# Altium footprint library ATM1099C-0627-ssy-1.brd.PcbLib: 48 footprints (part 2 of 3)
Each footprint in its own frame and in the unit in brackets; x right, y up, seen from the top. Pads: shape width x height; smd on the part's side, far side on the other; paste and mask are expansions set on the pad; w line width, h text height; cw(c..) or ccw(c..) is an arc to the next point about the centre after c.
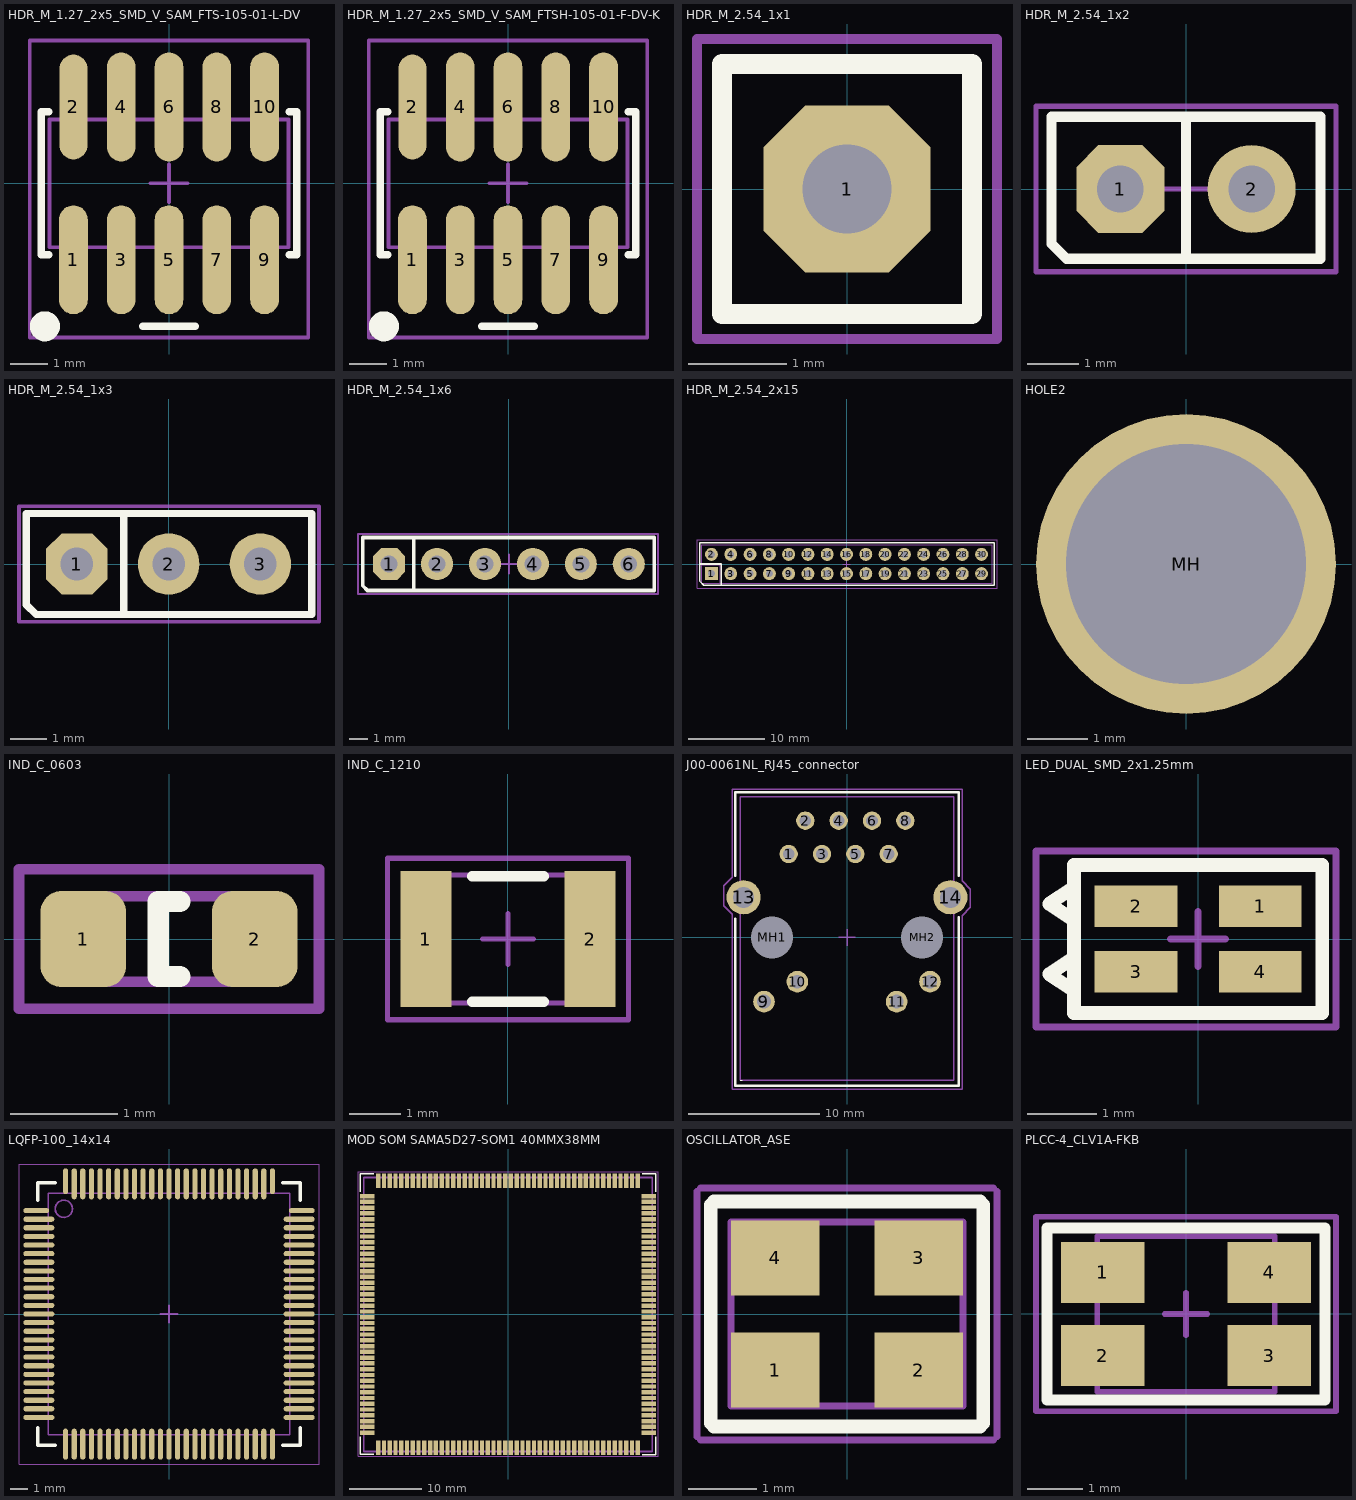
[diagram p1: the footprints below, top view; thin cyan lines are the x and y axes]

## HDR_M_1.27_2x5_SMD_V_SAM_FTS-105-01-L-DV [mil]
height 235
pads (10):
  oval 30x114 smd: 1(-100,-80) 3(-50,-80) 4(-50,80) 5(0,-80) 6(0,80) 7(50,-80) 8(50,80) 9(100,-80) 10(100,80)
  oval 29.13x109.84 smd: 2(-100,80)
Top Overlay:
  circle w15.75: c-129.92,-149.61 r7.87
  lines w7.87: -125.98,-74.8 -133.86,-74.8 -133.86,74.8 -125.98,74.8 ; -27.56,-149.61 27.56,-149.61 ; 125.98,-74.8 133.86,-74.8 133.86,74.8 125.98,74.8
Mechanical 11:
  lines w3.94: -125,-66.93 125,-66.93 125,66.93 -125,66.93 -125,-66.93
  text "'.Designator'" at -46.26,-17.72 h39.37
  text "1" at -133.86,-125.98 h39.37
Mechanical 15:
  lines w3.94: -19.68,0 19.68,0 ; 0,-19.68 0,19.68 ; -145.67,-161.42 145.67,-161.42 145.67,149.61 -145.67,149.61 -145.67,-161.42
3D body "FTS-105-01-L-DV.stp": height 169.75, standoff -0.25, extent -124.99,-118.93 125,111.07

## HDR_M_1.27_2x5_SMD_V_SAM_FTSH-105-01-F-DV-K [mil]
height 235
pads (10):
  oval 30x114 smd: 1(-100,-80) 3(-50,-80) 4(-50,80) 5(0,-80) 6(0,80) 7(50,-80) 8(50,80) 9(100,-80) 10(100,80)
  oval 29.13x109.84 smd: 2(-100,80)
Top Overlay:
  circle w15.75: c-129.92,-149.61 r7.87
  lines w7.87: -125.98,-74.8 -133.86,-74.8 -133.86,74.8 -125.98,74.8 ; -27.56,-149.61 27.56,-149.61 ; 125.98,-74.8 133.86,-74.8 133.86,74.8 125.98,74.8
Mechanical 11:
  lines w3.94: -125,-66.93 125,-66.93 125,66.93 -125,66.93 -125,-66.93
  text "'.Designator'" at -35.43,-24.61 h39.37
  text "1" at -133.86,-125.98 h39.37
Mechanical 15:
  lines w3.94: -19.68,0 19.68,0 ; 0,-19.68 0,19.68 ; -145.67,-161.42 145.67,-161.42 145.67,149.61 -145.67,149.61 -145.67,-161.42
3D body "FTSH-105-01-F-DV-K.stp": height 240.75, standoff -0.25, extent -125,-115 125,115

## HDR_M_2.54_1x1 [mm] "Header Male Vertical 1 Way"
pads (1):
  oct 1.7x1.7 hole 0.9: 1(0,0)
Top Overlay:
  lines w0.2: -1.27,-1.27 -1.27,1.27 1.27,1.27 1.27,-1.27 -1.27,-1.27
Mechanical 11:
  lines w0.1: -1.27,-1.27 1.27,-1.27 1.27,1.27 -1.27,1.27 -1.27,-1.27
  text ".Designator" at -0.65,-0.4 h0.8
Mechanical 15:
  lines w0.1: -1.524,-1.524 -1.524,1.524 1.524,1.524 1.524,-1.524 -1.524,-1.524
3D body "HDR_M_254_1x1.step": height 5.94, standoff -2.94, extent -1.27,-1.27 1.27,1.27

## HDR_M_2.54_1x2 [mm] "Header Male Vertical 4 Way 2.54mm Pitch"
pads (2):
  oct 1.7x1.7 hole 0.9: 1(-1.27,0)
  round 1.7 hole 0.9: 2(1.27,0)
Top Overlay:
  lines w0.2: 0,-1.3 0,1.35 ; -2.6,-1.06 -2.6,1.4 2.6,1.4 2.6,-1.35 -2.31,-1.35 -2.6,-1.06
Mechanical 11:
  lines w0.1: -2.6,-1.06 -2.31,-1.35 2.6,-1.35 2.6,1.4 -2.6,1.4 -2.6,-1.06
  text ".Designator" at 0.775,0.475 h1
Mechanical 15:
  lines w0.1: -0.5,0 0.5,0 ; 0,-0.5 0,0.5 ; -2.9,-1.6 2.9,-1.6 2.9,1.6 -2.9,1.6 -2.9,-1.6
3D body "HDR_M_254_1x2.step": height 5.94, standoff -2.94, extent -2.54,-1.27 2.54,1.27

## HDR_M_2.54_1x3 [mm] "Header Male Vertical 4 Way P=2.54mm"
pads (3):
  oct 1.7x1.7 hole 0.9: 1(-2.54,0)
  round 1.7 hole 0.9: 2(0,0) 3(2.54,0)
Top Overlay:
  lines w0.2: -1.24,-1.4 -1.24,1.4 ; -3.94,-1.125 -3.665,-1.4 3.96,-1.4 3.96,1.4 -3.94,1.4 -3.94,-1.125
Mechanical 11:
  lines w0.1: -1.24,-1.4 -1.24,1.4 ; -3.94,-1.125 -3.94,1.4 3.96,1.4 3.96,-1.4 -3.665,-1.4 -3.94,-1.125
  text ".Designator" at 1.025,0.65 h1
Mechanical 15:
  lines w0.1: -4.14,-1.6 -4.14,1.6 4.16,1.6 4.16,-1.6 -4.14,-1.6
3D body "HDR_M_254_1x3.step": height 5.94, standoff -2.94, extent -3.8,-1.265 3.82,1.275

## HDR_M_2.54_1x6 [mm] "Header Male Vertical 6 Way 2.54mm Pitch"
pads (6):
  oct 1.7x1.7 hole 0.9: 1(-6.35,0)
  round 1.7 hole 0.9: 2(-3.81,0) 3(-1.27,0) 4(1.27,0) 5(3.81,0) 6(6.35,0)
Top Overlay:
  lines w0.2: -5.05,-1.4 -5.05,1.4 ; -7.75,-1.15 -7.5,-1.4 7.7,-1.4 7.7,1.4 -7.75,1.4 -7.75,-1.15
Mechanical 11:
  lines w0.1: -5.05,-1.4 -5.05,1.4 ; -7.75,-1.15 -7.75,1.4 7.7,1.4 7.7,-1.4 -7.5,-1.4 -7.75,-1.15
  text ".Designator" at 1.075,0.55 h1
Mechanical 15:
  lines w0.1: -0.5,0 0.5,0 ; 0,-0.5 0,0.5 ; -8,-1.6 -8,1.6 7.9,1.6 7.9,-1.6 -8,-1.6
3D body "Samtec-TSW-106-07-G-S.step": height 8.38, standoff -2.54, extent -7.62,-1.27 7.62,1.27

## HDR_M_2.54_2x15 [mm] "Header Male Vertical 2x10 Way 2.54mm Pitch"
pads (30):
  rect 1.7x1.7 hole 0.9: 1(-17.788,-1.27)
  round 1.7 hole 0.9: 2(-17.788,1.27) 3(-15.248,-1.27) 4(-15.248,1.27) 5(-12.708,-1.27) 6(-12.708,1.27) 7(-10.168,-1.27) 8(-10.168,1.27) 9(-7.628,-1.27) 10(-7.628,1.27) 11(-5.088,-1.27) 12(-5.088,1.27) 13(-2.548,-1.27) 14(-2.548,1.27) 15(-0.008,-1.27) 16(-0.008,1.27) 17(2.532,-1.27) 18(2.532,1.27) 19(5.072,-1.27) 20(5.072,1.27) 21(7.612,-1.27) 22(7.612,1.27) 23(10.152,-1.27) 24(10.152,1.27) 25(12.692,-1.27) 26(12.692,1.27) 27(15.232,-1.27) 28(15.232,1.27) 29(17.772,-1.27) 30(17.772,1.27)
Top Overlay:
  lines w0.2: -19.312,0 -16.51,0 -16.51,-2.794 ; -19.312,-2.286 -19.312,2.794 19.423,2.794 19.423,-2.794 -18.804,-2.794 -19.312,-2.286
Mechanical 11:
  lines w0.1: -19.058,-0.127 -16.645,-0.127 -16.645,-2.54 ; -19.058,2.54 19.169,2.54 19.169,-2.54 -19.058,-2.54 -19.058,2.54 ; -19.058,2.54 -19.058,2.54
  text ".Designator" at 0,-1.27 h1
Mechanical 15:
  lines w0.1: -0.516,0 0.484,0 ; -0.008,-0.508 -0.008,0.508 ; -19.693,-3.175 -19.693,3.175 19.804,3.175 19.804,-3.175 -19.693,-3.175
3D body "pin_header_awl254-dg-g30d.stp": height 8.5, standoff -3, extent -19.058,-2.54 19.042,2.54

## HOLE2 [mm]
pads (1):
  round 5 hole 4: MH(0,0)
Mechanical 1:
  text "1" at -0.254,0 h0.64

## IND_C_0603 [mm] "Chip Inductor, 2-Leads, Body 1.6x0.8mm, IPC Medium Density"
height 0.8
pads (2):
  rrect50% 0.8x0.9 smd: 1(-0.8,0) 2(0.8,0)
Top Overlay:
  lines w0.2: 0.1,-0.35 -0.1,-0.35 -0.1,0.35 0.1,0.35
Mechanical 11:
  lines w0.1: -0.8,-0.4 0.8,-0.4 0.8,0.4 -0.8,0.4 -0.8,-0.4
  text ".Designator" at -0.2,-0.175 h0.35
Mechanical 13:
  lines w0.1: -0.8,-0.4 -0.8,0.4 0.8,0.4 0.8,-0.4 -0.8,-0.4
Mechanical 15:
  lines w0.1: -1.4,-0.65 -1.4,0.65 1.4,0.65 1.4,-0.65 -1.4,-0.65
  text "L" at -0.2,-0.29 h0.6
3D body "IND_C_0603.step": height 0.95, standoff 0, extent -0.8,-0.4 0.8,0.4

## IND_C_1210 [mm] "Chip Inductor, 2-Leads, Body 3.2x2.5mm, IPC Medium Density"
height 2.2
pads (2):
  rect 1x2.65 smd: 1(-1.6,0) 2(1.6,0)
Top Overlay:
  lines w0.2: -0.7,-1.225 0.7,-1.225 ; -0.7,1.225 0.7,1.225
Mechanical 11:
  lines w0.1: -2.35,-1.575 2.35,-1.575 2.35,1.575 -2.35,1.575 -2.35,-1.575
  text ".Designator" at 0.803,0.481 h1
Mechanical 13:
  lines w0.1: -1.6,-1.25 -1.6,1.25 1.6,1.25 1.6,-1.25 -1.6,-1.25
Mechanical 15:
  lines w0.1: -0.5,0 0.5,0 ; 0,-0.5 0,0.5 ; -2.35,-1.575 -2.35,1.575 2.35,1.575 2.35,-1.575 -2.35,-1.575
3D body "RES_2010.step": height 0.57, standoff 0, extent -1.55,-1.301 1.55,1.301

## J00-0061NL_RJ45_connector [mm] "J00-0061NL_RJ45_connector"
pads (16):
  round 1.4 / inner round 1.524 / far side round 1.4 hole 0.9: 1(-4.445,6.35) 2(-3.175,8.89) 3(-1.905,6.35) 4(-0.635,8.89) 5(0.635,6.35) 6(1.905,8.89) 7(3.175,6.35) 8(4.445,8.89)
  round 1.65 / inner round 1.524 / far side round 1.65 hole 1.05: 9(-6.325,-4.9) 10(-3.785,-3.38) 11(3.785,-4.9) 12(6.325,-3.38)
  round 2.6 / inner round 1.524 / far side round 2.6 hole 1.6: 13(-7.875,3.05) 14(7.875,3.05)
  round 2.3 / inner round 1.524 / far side round 2.3 hole 3.2 unplated: MH1(-5.715,0)
  round 2 / inner round 1.524 / far side round 2 hole 3.2 unplated: MH2(5.715,0)
Top Overlay:
  lines w0.025: -8.15,-10.9 -8,-10.9
  lines w0.2: -8.509,1.397 -8.509,-11.303 8.509,-11.303 8.509,1.524 ; -8.509,4.699 -8.509,11.049 -8.382,11.049 8.382,11.049 8.509,11.049 8.509,4.699
Mechanical 11:
  lines w0.1: -8.15,-10.9 -8.15,1.45 -8.15,10.7 8.15,10.7 8.15,1.45 8.15,-10.9 -8.15,-10.9
  text "'.Designator'" at 1.65,0.225 h1
  text "1" at -5.207,5.969 h1
Mechanical 15:
  lines w0.1: -0.635,0 0.635,0 ; 0,-0.635 0,0.635 ; -9.398,2.413 -8.763,1.778 -8.763,-11.557 8.763,-11.557 8.763,1.651 9.398,2.286 9.398,3.683 8.763,4.318 8.763,11.303 -8.763,11.303 -8.763,4.572 -9.398,3.937 -9.398,2.413
3D body: height 1, standoff 0, extent 4.445,-10.795 6.35,-8.89
3D body: height 1, standoff 0, extent -6.35,-10.9 -3.81,-8.89
3D body: height 10, standoff 7, extent -3.175,-10.795 3.175,-5.08
3D body: height 13.84, standoff 10, extent -8.15,-10.9 8.15,10.7
3D body: height 10, standoff 0, extent -8.15,8.89 8.15,10.668
3D body: height 10, standoff 0, extent 6.35,-10.795 8.15,10.7
3D body: height 10, standoff 0, extent -8.15,-10.9 -6.35,10.7
3D body: height 0, standoff -3, extent 6.027,-3.679 6.625,-3.08
3D body: height 0, standoff -3, extent 3.487,-5.199 4.085,-4.6
3D body: height 0, standoff -3, extent -6.623,-5.199 -6.025,-4.6
3D body: height 0, standoff -3, extent -4.082,-3.679 -3.485,-3.08
3D body: height 0, standoff -3, extent -4.742,6.051 -4.145,6.65
3D body: height 0, standoff -3, extent -2.202,6.051 -1.605,6.65
3D body: height 0, standoff -3, extent 0.338,6.051 0.935,6.65
3D body: height 0, standoff -3, extent 2.877,6.051 3.475,6.65
3D body: height 0, standoff -3, extent 4.147,8.591 4.745,9.19
3D body: height 0, standoff -3, extent 1.608,8.591 2.205,9.19
3D body: height 0, standoff -3, extent -0.932,8.591 -0.335,9.19
3D body: height 0, standoff -3, extent -3.472,8.591 -2.875,9.19
3D body: height 0, standoff -1, extent -6.523,-5.099 -6.125,-4.7
3D body: height 0, standoff -1, extent -3.983,-3.579 -3.585,-3.18

## LED_DUAL_SMD_2x1.25mm [mm] "LED 2X1.2MM RD/GN WTR CLR SMD"
pads (4):
  rect 1.2x0.6 smd: 1(0.9,0.475) 2(-0.9,0.475) 3(-0.9,-0.475) 4(0.9,-0.475)
Top Overlay:
  lines w0.2: -1.81,-0.74 -2.159,-0.508 -1.803,-0.271 ; -1.81,0.74 -2.159,0.508 -1.803,0.271 ; -1.8,-1.075 -1.8,1.075 1.8,1.075 1.8,-1.075 -1.8,-1.075
Mechanical 11:
  lines w0.1: -1.81,-0.74 -2.159,-0.508 -1.803,-0.271 ; -1.81,0.74 -2.159,0.508 -1.803,0.271 ; -1.775,-1.025 1.775,-1.025 1.775,1.025 -1.775,1.025 -1.775,-1.025
  text ".Designator" at 0.725,0.4 h0.8
Mechanical 15:
  lines w0.1: -0.4,0 0.4,0 ; 0,-0.4 0,0.4 ; -2.35,-1.275 -2.35,1.275 2,1.275 2,-1.275 -2.35,-1.275
3D body "led_0603 Red.step": height 0.6, standoff 0, extent -0.81,-0.05 0.81,0.75
3D body "led_0603 Green.step": height 0.6, standoff 0, extent -0.81,-0.75 0.81,0.05
3D body: height 0.33, standoff 0, extent -0.813,-0.375 0.813,0.375

## LQFP-100_14x14 [mm] "LQFP-100"
pads (100):
  oval 1.5x0.3 smd: 1(-7.7,6) 75(7.7,6)
  oval 1.8x0.3 smd: 2(-7.55,5.5) 3(-7.55,5) 4(-7.55,4.5) 5(-7.55,4) 6(-7.55,3.5) 7(-7.55,3) 8(-7.55,2.5) 9(-7.55,2) 10(-7.55,1.5) 11(-7.55,1) 12(-7.55,0.5) 13(-7.55,0) 14(-7.55,-0.5) 15(-7.55,-1) 16(-7.55,-1.5) 17(-7.55,-2) 18(-7.55,-2.5) 19(-7.55,-3) 20(-7.55,-3.5) 21(-7.55,-4) 22(-7.55,-4.5) 23(-7.55,-5) 24(-7.55,-5.5) 25(-7.55,-6) 51(7.55,-6) 52(7.55,-5.5) 53(7.55,-5) 54(7.55,-4.5) 55(7.55,-4) 56(7.55,-3.5) 57(7.55,-3) 58(7.55,-2.5) 59(7.55,-2) 60(7.55,-1.5) 61(7.55,-1) 62(7.55,-0.5) 63(7.55,0) 64(7.55,0.5) 65(7.55,1) 66(7.55,1.5) 67(7.55,2) 68(7.55,2.5) 69(7.55,3) 70(7.55,3.5) 71(7.55,4) 72(7.55,4.5) 73(7.55,5) 74(7.55,5.5)
  oval 0.3x1.8 smd: 26(-6,-7.55) 27(-5.5,-7.55) 28(-5,-7.55) 29(-4.5,-7.55) 30(-4,-7.55) 31(-3.5,-7.55) 32(-3,-7.55) 33(-2.5,-7.55) 34(-2,-7.55) 35(-1.5,-7.55) 36(-1,-7.55) 37(-0.5,-7.55) 38(0,-7.55) 39(0.5,-7.55) 40(1,-7.55) 41(1.5,-7.55) 42(2,-7.55) 43(2.5,-7.55) 44(3,-7.55) 45(3.5,-7.55) 46(4,-7.55) 47(4.5,-7.55) 48(5,-7.55) 49(5.5,-7.55) 50(6,-7.55) 77(5.5,7.55) 78(5,7.55) 79(4.5,7.55) 80(4,7.55) 81(3.5,7.55) 82(3,7.55) 83(2.5,7.55) 84(2,7.55) 85(1.5,7.55) 86(1,7.55) 87(0.5,7.55) 88(0,7.55) 89(-0.5,7.55) 90(-1,7.55) 91(-1.5,7.55) 92(-2,7.55) 93(-2.5,7.55) 94(-3,7.55) 95(-3.5,7.55) 96(-4,7.55) 97(-4.5,7.55) 98(-5,7.55) 99(-5.5,7.55)
  oval 0.3x1.5 smd: 76(6,7.7) 100(-6,7.7)
Top Overlay:
  lines w0.2: -7.62,-6.604 -7.62,-7.62 -6.604,-7.62 ; -7.62,6.604 -7.62,7.62 -6.604,7.62 ; 6.604,-7.62 7.62,-7.62 7.62,-6.604 ; 6.604,7.62 7.62,7.62 7.62,6.604
  text "." at -8.382,6.985 h1.5
Mechanical 11:
  lines w0.1: -7,-7 -7,7 7,7 7,-7 -7,-7
Mechanical 13:
  circle w0.1: c-6.1,6.1 r0.5
  lines w0.1: -7,-7 -7,7 7,7 7,-7 -7,-7
Mechanical 15:
  lines w0.05: -8.7,-8.7 -8.7,8.7 8.7,8.7 8.7,-8.7 -8.7,-8.7
  lines w0.1: -0.5,0 0.5,0 ; 0,-0.5 0,0.5
3D body "User Library-LQFP100_Grid_0_5.STEP": height 1.6, standoff 0, extent -8,-8 8,8

## MOD SOM SAMA5D27-SOM1 40MMX38MM [mm]
pads (176):
  rect 2x0.6 smd: 1(-19.5,16.4) 2(-19.5,15.6) 3(-19.5,14.8) 4(-19.5,14) 5(-19.5,13.2) 6(-19.5,12.4) 7(-19.5,11.6) 8(-19.5,10.8) 9(-19.5,10) 10(-19.5,9.2) 11(-19.5,8.4) 12(-19.5,7.6) 13(-19.5,6.8) 14(-19.5,6) 15(-19.5,5.2) 16(-19.5,4.4) 17(-19.5,3.6) 18(-19.5,2.8) 19(-19.5,2) 20(-19.5,1.2) 21(-19.5,0.4) 22(-19.5,-0.4) 23(-19.5,-1.2) 24(-19.5,-2) 25(-19.5,-2.8) 26(-19.5,-3.6) 27(-19.5,-4.4) 28(-19.5,-5.2) 29(-19.5,-6) 30(-19.5,-6.8) 31(-19.5,-7.6) 32(-19.5,-8.4) 33(-19.5,-9.2) 34(-19.5,-10) 35(-19.5,-10.8) 36(-19.5,-11.6) 37(-19.5,-12.4) 38(-19.5,-13.2) 39(-19.5,-14) 40(-19.5,-14.8) 41(-19.5,-15.6) 42(-19.5,-16.4) 89(19.5,-16.4) 90(19.5,-15.6) 91(19.5,-14.8) 92(19.5,-14) 93(19.5,-13.2) 94(19.5,-12.4) 95(19.5,-11.6) 96(19.5,-10.8) 97(19.5,-10) 98(19.5,-9.2) 99(19.5,-8.4) 100(19.5,-7.6) 101(19.5,-6.8) 102(19.5,-6) 103(19.5,-5.2) 104(19.5,-4.4) 105(19.5,-3.6) 106(19.5,-2.8) 107(19.5,-2) 108(19.5,-1.2) 109(19.5,-0.4) 110(19.5,0.4) 111(19.5,1.2) 112(19.5,2) 113(19.5,2.8) 114(19.5,3.6) 115(19.5,4.4) 116(19.5,5.2) 117(19.5,6) 118(19.5,6.8) 119(19.5,7.6) 120(19.5,8.4) 121(19.5,9.2) 122(19.5,10) 123(19.5,10.8) 124(19.5,11.6) 125(19.5,12.4) 126(19.5,13.2) 127(19.5,14) 128(19.5,14.8) 129(19.5,15.6) 130(19.5,16.4)
  rect 0.6x2 smd: 43(-18,-18.5) 44(-17.2,-18.5) 45(-16.4,-18.5) 46(-15.6,-18.5) 47(-14.8,-18.5) 48(-14,-18.5) 49(-13.2,-18.5) 50(-12.4,-18.5) 51(-11.6,-18.5) 52(-10.8,-18.5) 53(-10,-18.5) 54(-9.2,-18.5) 55(-8.4,-18.5) 56(-7.6,-18.5) 57(-6.8,-18.5) 58(-6,-18.5) 59(-5.2,-18.5) 60(-4.4,-18.5) 61(-3.6,-18.5) 62(-2.8,-18.5) 63(-2,-18.5) 64(-1.2,-18.5) 65(-0.4,-18.5) 66(0.4,-18.5) 67(1.2,-18.5) 68(2,-18.5) 69(2.8,-18.5) 70(3.6,-18.5) 71(4.4,-18.5) 72(5.2,-18.5) 73(6,-18.5) 74(6.8,-18.5) 75(7.6,-18.5) 76(8.4,-18.5) 77(9.2,-18.5) 78(10,-18.5) 79(10.8,-18.5) 80(11.6,-18.5) 81(12.4,-18.5) 82(13.2,-18.5) 83(14,-18.5) 84(14.8,-18.5) 85(15.6,-18.5) 86(16.4,-18.5) 87(17.2,-18.5) 88(18,-18.5) 131(18,18.5) 132(17.2,18.5) 133(16.4,18.5) 134(15.6,18.5) 135(14.8,18.5) 136(14,18.5) 137(13.2,18.5) 138(12.4,18.5) 139(11.6,18.5) 140(10.8,18.5) 141(10,18.5) 142(9.2,18.5) 143(8.4,18.5) 144(7.6,18.5) 145(6.8,18.5) 146(6,18.5) 147(5.2,18.5) 148(4.4,18.5) 149(3.6,18.5) 150(2.8,18.5) 151(2,18.5) 152(1.2,18.5) 153(0.4,18.5) 154(-0.4,18.5) 155(-1.2,18.5) 156(-2,18.5) 157(-2.8,18.5) 158(-3.6,18.5) 159(-4.4,18.5) 160(-5.2,18.5) 161(-6,18.5) 162(-6.8,18.5) 163(-7.6,18.5) 164(-8.4,18.5) 165(-9.2,18.5) 166(-10,18.5) 167(-10.8,18.5) 168(-11.6,18.5) 169(-12.4,18.5) 170(-13.2,18.5) 171(-14,18.5) 172(-14.8,18.5) 173(-15.6,18.5) 174(-16.4,18.5) 175(-17.2,18.5) 176(-18,18.5)
Top Overlay:
  lines w0.2: -20.5,-17 -20.5,-19.4 -18.6,-19.4 ; -20.5,17 -20.5,19.5 -18.6,19.5 ; 18.6,-19.5 20.5,-19.5 20.5,-17 ; 18.6,19.5 20.5,19.5 20.5,17
  text "." at -21.5,18.2 h1
Mechanical 11:
  lines w0.254: -20,-19 20,-19 20,19 -20,19 -20,-19
  text "1" at -20.2,16.5 h1
  text "'.Designator'" at -5.4,-0.3 h1
Mechanical 15:
  lines w0.1: -20.8,-19.7 -20.8,19.8 20.8,19.8 20.8,-19.7 -20.8,-19.7
3D body: height 1, standoff 0, extent -20,-19 20,19
3D body: height 1.2, standoff 0.8, extent 1.4,-9.6 13.1,1.3
3D body: height 1.21, standoff 1.2, extent 2.004,-0.299 3,0.699
3D body: height 1.2, standoff 0.8, extent 6.5,8.6 12.5,13.5
3D body: height 1.21, standoff 1.2, extent 11.403,8.901 12.2,9.699
3D body: height 1.2, standoff 0.8, extent -13.5,10.5 -10.5,13.5
3D body: height 1.2, standoff 0.8, extent -8.5,14.5 -7,16
3D body: height 1.2, standoff 0.8, extent -15,-11.1 -13,-9.1
3D body: height 1.2, standoff 1.2, extent -14.797,-9.699 -14.398,-9.3
3D body: height 1.2, standoff 1.2, extent -10.998,10.601 -10.6,11
3D body: height 1, standoff 0.8, extent 4.95,2.5 5.45,3.5
3D body: height 1, standoff 0.8, extent 4,2.5 4.5,3.5
3D body: height 1, standoff 0.8, extent 6,2.5 6.5,3.5
3D body: height 1, standoff 0.8, extent 7,2.5 7.5,3.5
3D body: height 1, standoff 0.8, extent 8,2.5 8.5,3.5
3D body: height 1, standoff 0.8, extent 9,2.5 9.5,3.5
3D body: height 0.8, standoff 0.2, extent 10,2.5 10.5,3.5
3D body: height 1, standoff 0.8, extent 11,2.5 11.5,3.5
3D body: height 1, standoff 0.8, extent 12,2.5 12.5,3.5
3D body: height 1, standoff 0.8, extent 13,2.5 13.5,3.5

## OSCILLATOR_ASE [mm]
height 1.2
pads (4):
  rect 1.3x1.1 smd: 1(-1.05,-0.825) 2(1.05,-0.825) 3(1.05,0.825) 4(-1.05,0.825)
Top Overlay:
  lines w0.2: -2,-1.6 -2,1.6 ; -1.95,-1.65 1.95,-1.65 ; -1.95,1.65 1.95,1.65 ; 2,-1.6 2,1.6
  text "." at -1.625,-2.025 h1
Mechanical 11:
  lines w0.102: -1.7,-1.35 -1.7,1.35 1.7,1.35 1.7,-1.35 -1.7,-1.35
Mechanical 15:
  lines w0.102: -2.2,-1.8 -2.2,1.8 ; -2.15,-1.85 2.15,-1.85 ; -2.15,1.85 2.15,1.85 ; 2.2,-1.8 2.2,1.8
3D body "ABRACON_ASE.STEP": height 1, standoff -0.04, extent -1.7,-1.35 1.7,1.35

## PLCC-4_CLV1A-FKB [mm] "PLCC4 3 in 1 SMD LED"
height 2.1
pads (4):
  rect 1.5x1.1 smd: 1(-1.5,0.75) 2(-1.5,-0.75) 3(1.5,-0.75) 4(1.5,0.75)
Top Overlay:
  lines w0.2: -2.5,-1.55 2.5,-1.55 2.5,1.55 -2.5,1.55 -2.5,-1.55
  text "." at -2.95,1.275 h1
Mechanical 11:
  lines w0.1: -1.6,-1.4 -1.6,1.4 1.6,1.4 1.6,-1.4 -1.6,-1.4
  text "." at -2.025,0.825 h1
  text ".Designator" at -0.901,-0.42 h1
Mechanical 15:
  lines w0.1: -0.381,0 0.381,0 ; 0,-0.381 0,0.381 ; -2.7,-1.75 -2.7,1.75 2.7,1.75 2.7,-1.75 -2.7,-1.75 ; -2.7,-1.75 -2.7,-1.75
3D body "CLV1AFKB.STEP": height 1.9, standoff 0, extent -1.75,-1.4 1.75,1.4